# Altium footprint library CPD.PcbLib: 58 footprints (part 4 of 4)
Each footprint in its own frame and in the unit in brackets; x right, y up, seen from the top. Pads: shape width x height; smd on the part's side, far side on the other; paste and mask are expansions set on the pad; w line width, h text height; cw(c..) or ccw(c..) is an arc to the next point about the centre after c.
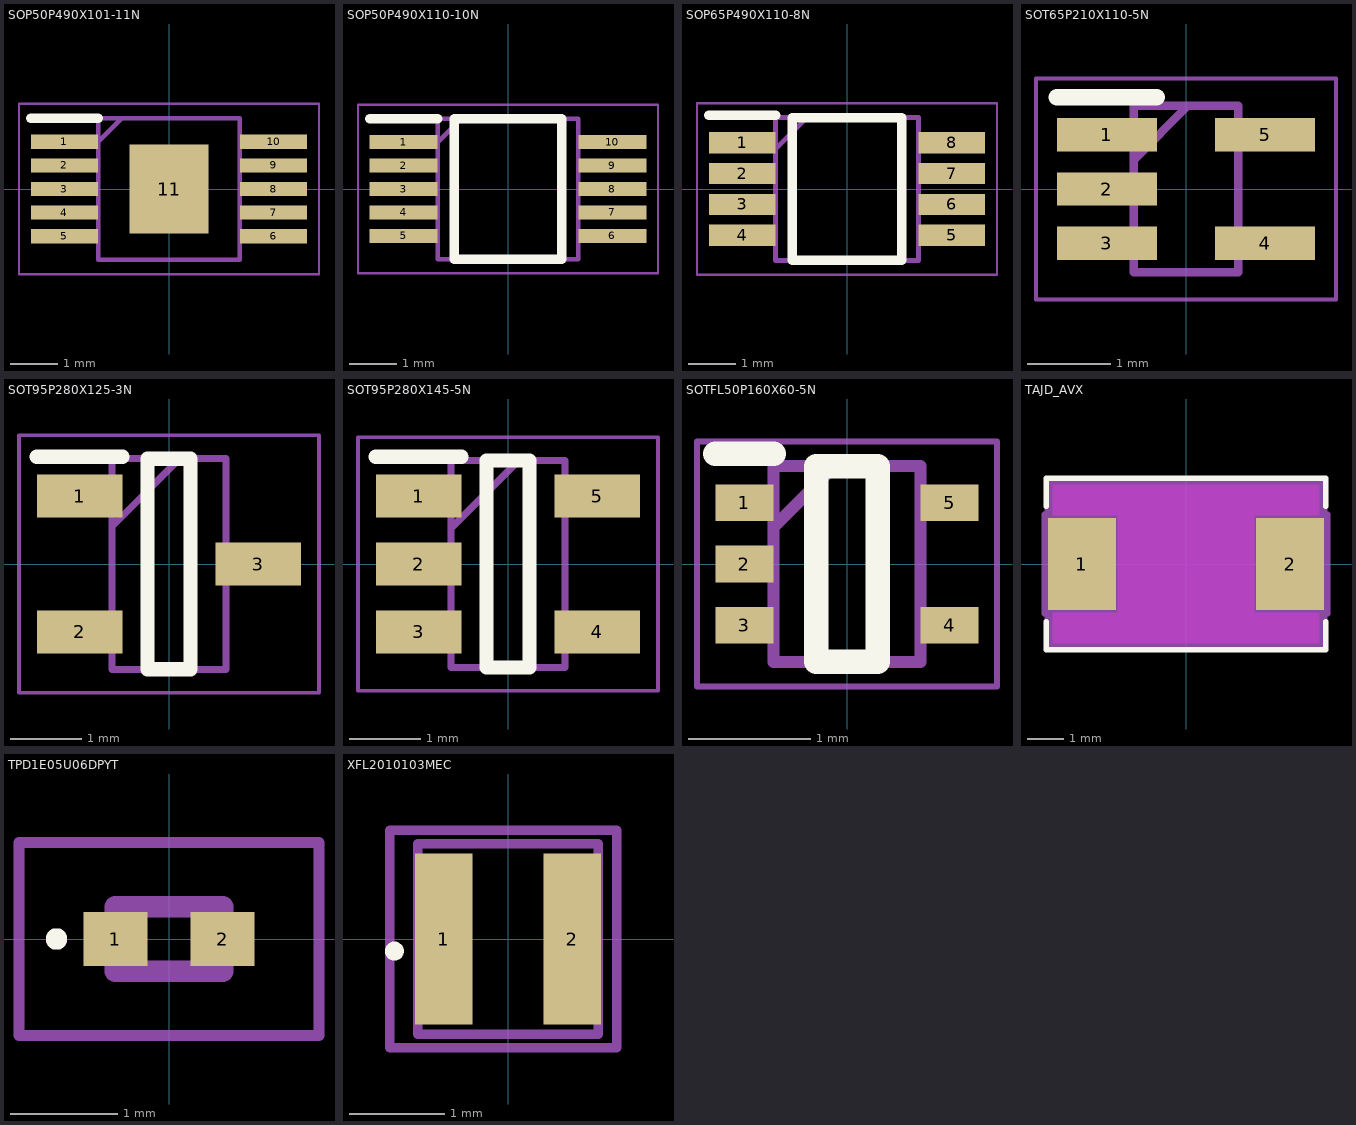
[diagram p3: the footprints below, top view; thin cyan lines are the x and y axes]

## SOP50P490X101-11N [mm]
pads (11):
  rect 1.425x0.3 smd: 1(-2.212,1) 2(-2.212,0.5) 3(-2.212,0) 4(-2.212,-0.5) 5(-2.212,-1) 6(2.212,-1) 7(2.212,-0.5) 8(2.212,0) 9(2.212,0.5) 10(2.212,1)
  rect 1.68x1.88 smd: 11(0,0)
Top Overlay:
  lines w0.2: -2.925,1.5 -1.5,1.5
Mechanical 13:
  lines w0.1: -1.5,1 -1,1.5 ; -1.5,-1.5 1.5,-1.5 1.5,1.5 -1.5,1.5 -1.5,-1.5
Mechanical 15:
  lines w0.05: -3.175,-1.801 3.175,-1.801 3.175,1.801 -3.175,1.801 -3.175,-1.801
3D body "LT3960JMSE.stp": height 1.01, standoff 0, extent -2.45,-1.5 2.45,1.5

## SOP50P490X110-10N [mm]
pads (10):
  rect 1.45x0.3 smd: 1(-2.225,1) 2(-2.225,0.5) 3(-2.225,0) 4(-2.225,-0.5) 5(-2.225,-1) 6(2.225,-1) 7(2.225,-0.5) 8(2.225,0) 9(2.225,0.5) 10(2.225,1)
Top Overlay:
  lines w0.2: -2.95,1.5 -1.5,1.5 ; -1.15,-1.5 1.15,-1.5 1.15,1.5 -1.15,1.5 -1.15,-1.5
Mechanical 13:
  lines w0.1: -1.5,1 -1,1.5 ; -1.5,-1.5 1.5,-1.5 1.5,1.5 -1.5,1.5 -1.5,-1.5
Mechanical 15:
  lines w0.05: -3.2,-1.8 3.2,-1.8 3.2,1.8 -3.2,1.8 -3.2,-1.8
3D body "ADG736BRMZ.stp": height 1.1, standoff 0, extent -2.45,-1.5 2.45,1.5

## SOP65P490X110-8N [mm]
pads (8):
  rect 1.4x0.45 smd: 1(-2.2,0.975) 2(-2.2,0.325) 3(-2.2,-0.325) 4(-2.2,-0.975) 5(2.2,-0.975) 6(2.2,-0.325) 7(2.2,0.325) 8(2.2,0.975)
Top Overlay:
  lines w0.2: -2.9,1.55 -1.5,1.55 ; -1.15,-1.5 -1.15,1.5 1.15,1.5 1.15,-1.5 -1.15,-1.5
Mechanical 13:
  lines w0.1: -1.5,0.85 -0.85,1.5 ; -1.5,-1.5 -1.5,1.5 1.5,1.5 1.5,-1.5 -1.5,-1.5
Mechanical 15:
  lines w0.05: -3.15,-1.8 -3.15,1.8 3.15,1.8 3.15,-1.8 -3.15,-1.8
3D body "TMP275AIDGKR.stp": height 1.1, standoff 0, extent -2.451,-1.499 2.451,1.499

## SOT65P210X110-5N [mm]
pads (5):
  rect 1.2x0.4 smd: 1(-0.95,0.65) 2(-0.95,0) 3(-0.95,-0.65) 4(0.95,-0.65) 5(0.95,0.65)
Top Overlay:
  lines w0.2: -1.55,1.1 -0.35,1.1
Mechanical 13:
  lines w0.1: -0.625,0.35 0.025,1 ; -0.625,-1 0.625,-1 0.625,1 -0.625,1 -0.625,-1
Mechanical 15:
  lines w0.05: -1.8,-1.325 1.8,-1.325 1.8,1.325 -1.8,1.325 -1.8,-1.325
3D body "LMV7239M7_NOPB.stp": height 1, standoff 0, extent -1.05,-1 1.05,1

## SOT95P280X125-3N [mm]
pads (3):
  rect 1.2x0.6 smd: 1(-1.25,0.95) 2(-1.25,-0.95) 3(1.25,0)
Top Overlay:
  lines w0.2: -1.85,1.5 -0.65,1.5 ; -0.3,-1.475 -0.3,1.475 0.3,1.475 0.3,-1.475 -0.3,-1.475
Mechanical 13:
  lines w0.1: -0.8,0.525 0.15,1.475 ; -0.8,-1.475 -0.8,1.475 0.8,1.475 0.8,-1.475 -0.8,-1.475
Mechanical 15:
  lines w0.05: -2.1,-1.8 -2.1,1.8 2.1,1.8 2.1,-1.8 -2.1,-1.8
3D body "AO3407A.stp": height 1.25, standoff 0, extent -1.4,-1.475 1.4,1.475

## SOT95P280X145-5N [mm]
pads (5):
  rect 1.2x0.6 smd: 1(-1.25,0.95) 2(-1.25,0) 3(-1.25,-0.95) 4(1.25,-0.95) 5(1.25,0.95)
Top Overlay:
  lines w0.2: -1.85,1.5 -0.65,1.5 ; -0.3,-1.45 -0.3,1.45 0.3,1.45 0.3,-1.45 -0.3,-1.45
Mechanical 13:
  lines w0.1: -0.8,0.5 0.15,1.45 ; -0.8,-1.45 -0.8,1.45 0.8,1.45 0.8,-1.45 -0.8,-1.45
Mechanical 15:
  lines w0.05: -2.1,-1.775 -2.1,1.775 2.1,1.775 2.1,-1.775 -2.1,-1.775
3D body "OPA387DBVR.stp": height 1.2, standoff 0, extent -1.4,-1.45 1.4,1.45

## SOTFL50P160X60-5N [mm]
pads (5):
  rect 0.475x0.3 smd: 1(-0.838,0.5) 2(-0.838,0) 3(-0.838,-0.5) 4(0.838,-0.5) 5(0.838,0.5)
Top Overlay:
  lines w0.2: -1.075,0.9 -0.6,0.9 ; -0.25,-0.8 -0.25,0.8 0.25,0.8 0.25,-0.8 -0.25,-0.8
Mechanical 13:
  lines w0.1: -0.6,0.3 -0.1,0.8 ; -0.6,-0.8 -0.6,0.8 0.6,0.8 0.6,-0.8 -0.6,-0.8
Mechanical 15:
  lines w0.05: -1.225,-1 -1.225,1 1.225,1 1.225,-1 -1.225,-1
3D body "TPD2E2U06DRLR-P.stp": height 0.6, standoff 0, extent -0.8,-0.8 0.8,0.8

## TAJD_AVX [mil]
pads (2):
  rect 74x100 smd paste+0 mask+0: 1(-113.5,0) 2(113.5,0)
Top Layer keep-out:
  region: -145.5,-86.5 -145.5,-53 145.5,-53 145.5,-86.5
  region: -145.5,53 -145.5,86.5 145.5,86.5 145.5,53
  region: -74.5,-53 -74.5,53 74.5,53 74.5,-53
Top Overlay:
  lines w6: -152.5,-62.95 -152.5,-93.5 152.5,-93.5 152.5,-62.95 ; -152.5,62.95 -152.5,93.5 152.5,93.5 152.5,62.95
Keep-Out Layer:
  region: -74.5,-53 -74.5,53 74.5,53 74.5,-53
Mechanical 13:
  lines w1: -147.5,-88.5 -147.5,88.5 147.5,88.5 147.5,-88.5 -147.5,-88.5
Mechanical 15:
  region: -151.5,-54 -154.5,-54 -154.5,54 -151.5,54 -151.5,92.5 151.5,92.5 151.5,54 154.5,54 154.5,-54 151.5,-54 151.5,-92.5 -151.5,-92.5
  lines w6: -154.5,-54 -151.5,-54 -151.5,-92.5 151.5,-92.5 151.5,-54 154.5,-54 154.5,54 151.5,54 151.5,92.5 -151.5,92.5 -151.5,54 -154.5,54 -154.5,-54
3D body "TAJD_AVX.step": height 124.02, standoff 0, extent -147.48,-88.5 147.48,88.5

## TPD1E05U06DPYT [mm]
pads (2):
  rect 0.6x0.5 smd: 1(-0.5,0) 2(0.5,0)
Top Overlay:
  lines w0.1: -1.1,0 cw(c-1.05,0) -1,0 cw(c-1.05,0) -1.1,0
Mechanical 13:
  lines w0.2: -0.5,-0.3 0.5,-0.3 0.5,0.3 -0.5,0.3 -0.5,-0.3
Mechanical 15:
  lines w0.1: -1.4,-0.9 1.4,-0.9 1.4,0.9 -1.4,0.9 -1.4,-0.9
3D body "TPD1E05U06DPYT.stp": height 0.6, standoff 0, extent -0.5,-0.3 0.5,0.3

## XFL2010103MEC [mm]
pads (2):
  rect 0.6x1.8 smd: 1(-0.675,0) 2(0.675,0)
Top Overlay:
  lines w0.1: -1.243,-0.127 ccw(c-1.193,-0.127) -1.143,-0.127 ccw(c-1.193,-0.127) -1.243,-0.127
Mechanical 13:
  lines w0.1: -0.95,-1 -0.95,1 0.95,1 0.95,-1 -0.95,-1
Mechanical 15:
  lines w0.1: -1.243,-1.143 1.143,-1.143 1.143,1.143 -1.243,1.143 -1.243,-1.143
3D body "XFL2010-103MEC.stp": height 1.1, standoff 0, extent -0.95,-1 0.95,1